# Altium footprint library Connector FPC.PcbLib: 30 footprints (part 2 of 2)
Each footprint in its own frame and in the unit in brackets; x right, y up, seen from the top. Pads: shape width x height; smd on the part's side, far side on the other; paste and mask are expansions set on the pad; w line width, h text height; cw(c..) or ccw(c..) is an arc to the next point about the centre after c.
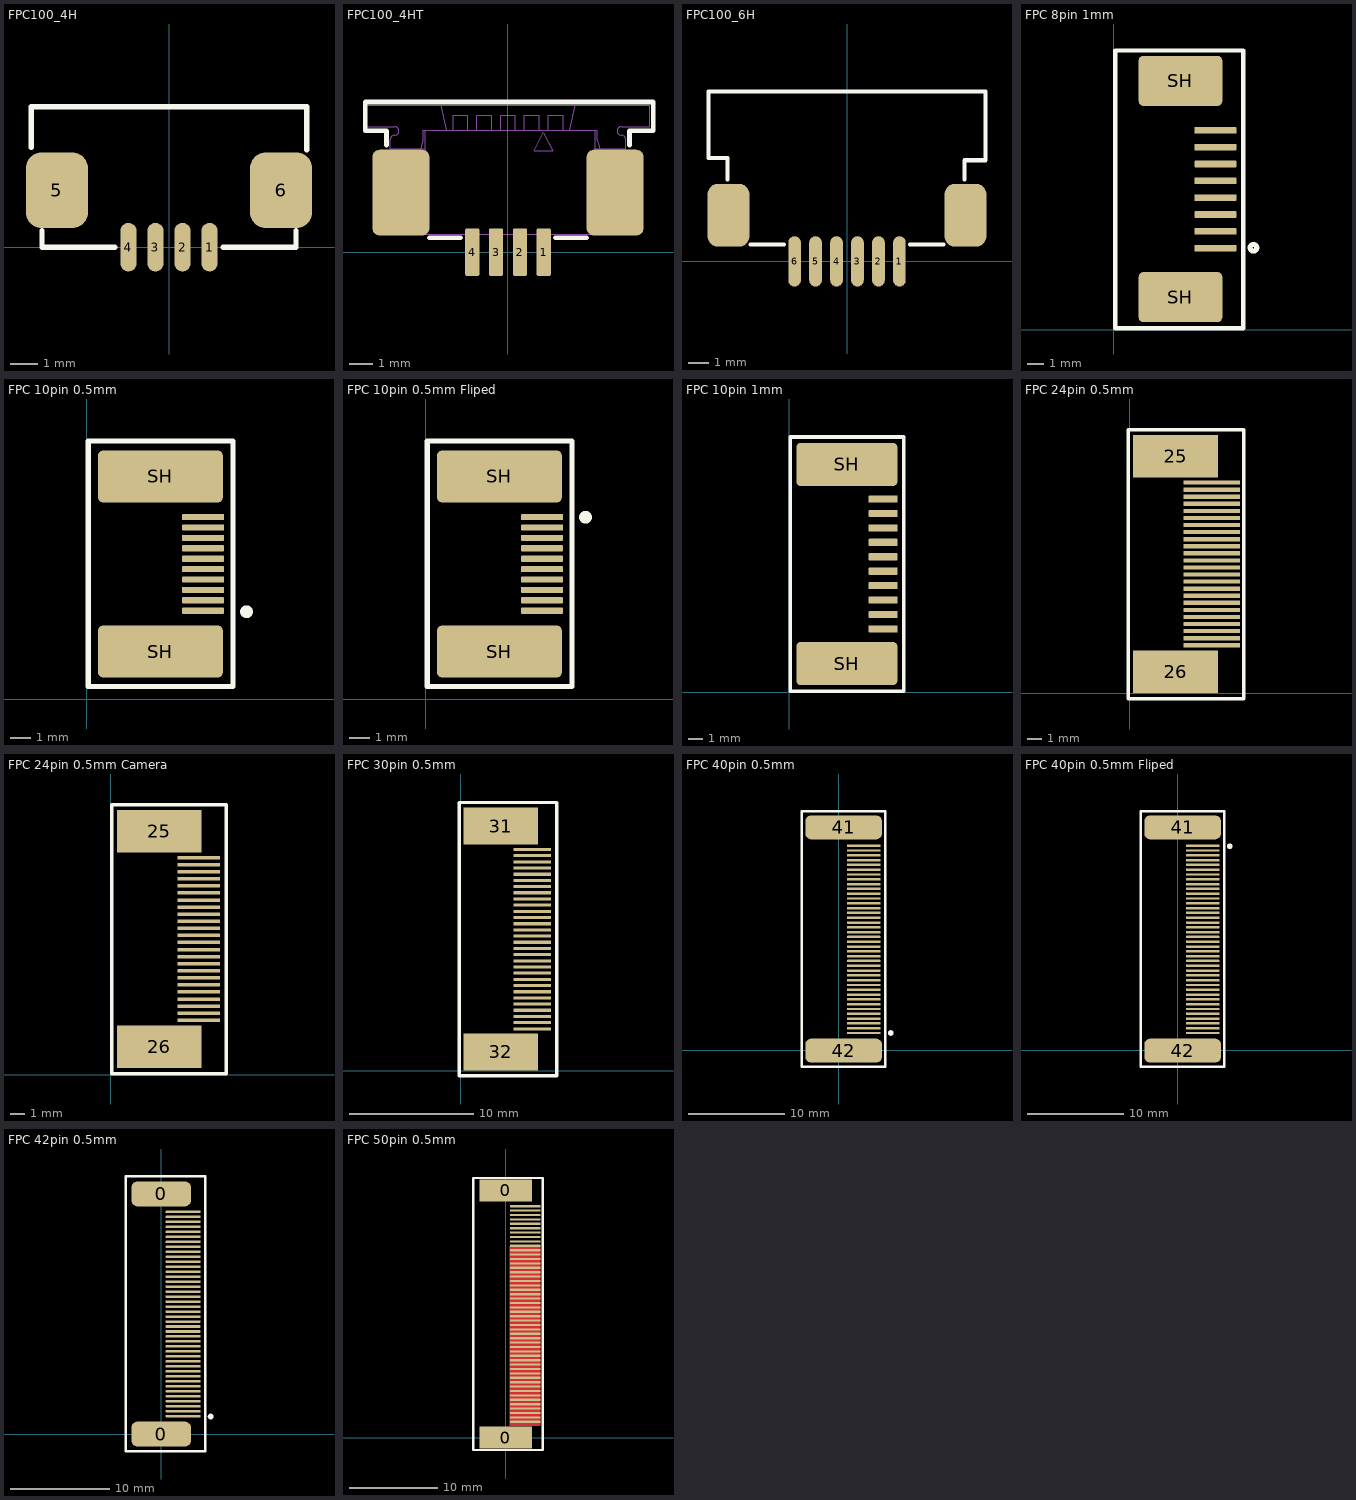
[diagram p1: the footprints below, top view; thin cyan lines are the x and y axes]

## FPC100_4H [mm] "FPC, 1mm, Horizental, Bot. Contact, Molex 200529-0040"
height 0.8
pads (6):
  oval 0.6x1.8 smd: 1(1.5,0) 2(0.5,0) 3(-0.5,0) 4(-1.5,0)
  rrect50% 2.3x2.8 smd: 5(-4.15,2.1) 6(4.15,2.1)
Top Overlay:
  lines w0.2: -5.1,3.7 -5.1,5.2 5.1,5.2 5.1,3.6 ; -4.7,0.6 -4.7,0 -2,0 ; 2,0 4.7,0 4.7,0.6
3D body "2005290040.stp": height 1.93, standoff -0.03, extent -5,-0.25 5,5.05

## FPC100_4HT [mm] "TE Connectivity 4-pin ZIF connector TE84953-4"
height 2.74
pads (6):
  rrect25% 0.6x2 smd: 1(1.5,0) 2(0.5,0) 3(-0.5,0) 4(-1.5,0)
  rrect25% 2.4x3.6 smd: ""(-4.5,2.5) ""(4.5,2.5)
Top Overlay:
  lines w0.2: -5.1,4.5 -5.1,5.1 -6,5.1 -6,6.3 6.1,6.3 6.1,5.1 5.1,5.1 5.1,4.5 ; -3.3,0.6 -2,0.6 ; 2,0.6 3.3,0.6
Mechanical 13:
  lines w0.05: -4.56,0.75 -4.56,4.25 -3.47,4.25 -3.47,5.12 ; -4.56,3.2 -4.18,3.2 ; -4.28,4.25 -4.18,3.877 -4.18,2.98 -3.93,2.98 ; -4.229,4.25 -4.232,4.26 -5.072,4.26 ccw(c-5.072,4.16) -5.172,4.16 -5.172,3.859 ccw(c-5.072,3.859) -5.072,3.759 -4.762,3.759 cw(c-4.762,3.659) -4.662,3.659 -4.662,3.357 cw(c-4.762,3.357) -4.762,3.257 -5.072,3.257 ccw(c-5.072,3.157) -5.172,3.157 -5.172,2.856 ccw(c-5.072,2.856) -5.072,2.756 -4.762,2.756 cw(c-4.762,2.656) -4.662,2.656 -4.662,2.355 cw(c-4.762,2.355) -4.762,2.255 -5.072,2.255 ccw(c-5.072,2.155) -5.172,2.155 -5.172,1.853 ccw(c-5.072,1.853) -5.072,1.753 -4.762,1.753 cw(c-4.762,1.653) -4.662,1.653 -4.662,1.352 cw(c-4.762,1.352) -4.762,1.252 -5.072,1.252 ccw(c-5.072,1.152) -5.172,1.152 -5.172,0.85 ccw(c-5.072,0.85) -5.072,0.75 5.072,0.75 ccw(c5.072,0.85) 5.172,0.85 5.172,1.152 ccw(c5.072,1.152) 5.072,1.252 4.762,1.252 cw(c4.762,1.352) 4.662,1.352 4.662,1.653 cw(c4.762,1.653) 4.762,1.753 5.072,1.753 ccw(c5.072,1.853) 5.172,1.853 5.172,2.155 ccw(c5.072,2.155) 5.072,2.255 4.762,2.255 cw(c4.762,2.355) 4.662,2.355 4.662,2.656 cw(c4.762,2.656) 4.762,2.756 5.072,2.756 ccw(c5.072,2.856) 5.172,2.856 5.172,3.157 ccw(c5.072,3.157) 5.072,3.257 4.762,3.257 cw(c4.762,3.357) 4.662,3.357 4.662,3.659 cw(c4.762,3.659) 4.762,3.759 5.072,3.759 ccw(c5.072,3.859) 5.172,3.859 5.172,4.16 ccw(c5.072,4.16) 5.072,4.26 3.982,4.26 3.982,4.25 ; -3.93,0.75 -3.93,3.877 -3.83,4.25 ; -3.646,4.33 -3.55,4.69 -3.55,5.12 3.75,5.12 3.75,4.69 3.847,4.33 ; -3.47,4.33 -4.94,4.33 -4.94,4.73 cw(c-4.76,4.73) -4.76,4.91 ccw(c-4.76,5.09) -4.76,5.27 -5.96,5.27 -5.96,6.16 5.96,6.16 5.96,5.27 4.76,5.27 ccw(c4.76,5.09) 4.76,4.91 cw(c4.76,4.73) 4.94,4.73 4.94,4.33 3.67,4.33 ; -2.82,6.16 -2.59,5.12 ; -2.309,5.12 -2.309,5.75 -1.689,5.75 -1.689,5.12 ; -1.604,-0.26 -1.404,-0.26 ; -1.604,0.11 -1.404,0.11 ; -1.604,0.24 -1.404,0.24 ; -1.604,0.75 -1.604,-0.39 -1.404,-0.39 -1.404,0.75 ; -1.309,5.12 -1.309,5.75 -0.689,5.75 -0.689,5.12 ; -0.604,-0.26 -0.404,-0.26 ; -0.604,0.11 -0.404,0.11 ; -0.604,0.24 -0.404,0.24 ; -0.604,0.75 -0.604,-0.39 -0.404,-0.39 -0.404,0.75 ; -0.309,5.12 -0.309,5.75 0.311,5.75 0.311,5.12 ; 0.396,-0.26 0.596,-0.26 ; 0.396,0.11 0.596,0.11 ; 0.396,0.24 0.596,0.24 ; 0.396,0.75 0.396,-0.39 0.596,-0.39 0.596,0.75 ; 0.691,5.12 0.691,5.75 1.311,5.75 1.311,5.12 ; 1.396,-0.26 1.596,-0.26 ; 1.396,0.11 1.596,0.11 ; 1.396,0.24 1.596,0.24 ; 1.396,0.75 1.396,-0.39 1.596,-0.39 1.596,0.75 ; 1.691,5.12 1.691,5.75 2.311,5.75 2.311,5.12 ; 2.59,5.12 2.82,6.16 ; 3.67,5.12 3.67,4.25 4.56,4.25 4.56,0.75 ; 3.83,0.75 3.93,1.123 3.93,4.25 ; 3.93,2.02 4.56,2.02 ; 4.18,2.02 4.18,1.123 4.28,0.75 ; 4.18,4.25 4.18,4.26 ; 1.111,4.25 1.871,4.25 1.491,5.01 1.111,4.25
3D body "ZIF Conn TE 84953-4.STEP": height 2.58, standoff 0, extent -5.96,-0.39 5.96,6.16

## FPC100_6H [mm] "FPC 6pin pitch: 1.0mm, Molex 52271-0679"
height 3
pads (8):
  oval 0.6x2.4 smd: 1(2.5,0) 2(1.5,0) 3(0.5,0) 4(-0.5,0) 5(-1.5,0) 6(-2.5,0)
  rrect50% 2x3 smd: ""(-5.65,2.2) ""(5.65,2.2)
Top Overlay:
  lines w0.2: -5.7,3.9 -5.7,4.925 -6.6,4.925 -6.6,8.1 6.6,8.1 6.6,4.825 5.6,4.825 5.6,3.9 ; -4.6,0.8 -3,0.8 ; 3,0.8 4.6,0.8
3D body "522710679.stp": height 3, standoff 0, extent -6.5,-0.7 6.5,8

## FPC 8pin 1mm [mm] "FPC connector 8pin 1mm"
pads (10):
  rrect20% 2.5x0.4 smd: 1(6.081,4.867) 2(6.081,5.872) 3(6.081,6.876) 4(6.081,7.881) 5(6.081,8.886) 6(6.081,9.891) 7(6.081,10.895) 8(6.081,11.9)
  rrect20% 5x3 smd: SH(3.996,1.943) SH(3.996,14.851)
Top Overlay:
  lines w0.254: 0.098,0.088 0.098,16.661 7.75,16.661 7.75,0.088 0.098,0.088
  lines w0.3: 8.541,4.961 ccw(c8.355,4.887) 8.555,4.897
3D body "19r9649_84952-8.stp": height 2.54, standoff -0.02, extent 0.412,0.431 6.952,16.361

## FPC 10pin 0.5mm [mm] "FPC connector 10pin 0.5mm"
pads (12):
  rrect20% 2x0.3 smd: 1(5.581,4.258) 2(5.581,4.758) 3(5.581,5.258) 4(5.581,5.758) 5(5.581,6.258) 6(5.581,6.758) 7(5.581,7.258) 8(5.581,7.758) 9(5.581,8.258) 10(5.581,8.758)
  rrect20% 6x2.5 smd: SH(3.535,2.298) SH(3.535,10.71)
Top Overlay:
  lines w0.254: 0.065,0.624 7.022,0.624 7.022,12.411 0.065,12.411 0.065,0.624
  lines w0.3: 7.798,4.303 ccw(c7.671,4.213) 7.808,4.288
3D body "sfv10r1stae1hlf.stp": height 1.85, standoff -0.02, extent 0.586,1.241 5.486,11.741

## FPC 10pin 0.5mm Fliped [mm] "FPC connector 10pin 0.5mm"
pads (12):
  rrect20% 2x0.3 smd: 1(5.581,8.758) 2(5.581,8.258) 3(5.581,7.758) 4(5.581,7.258) 5(5.581,6.758) 6(5.581,6.258) 7(5.581,5.758) 8(5.581,5.258) 9(5.581,4.758) 10(5.581,4.258)
  rrect20% 6x2.5 smd: SH(3.535,2.298) SH(3.535,10.71)
Top Overlay:
  lines w0.254: 0.065,0.624 0.065,12.411 7.022,12.411 7.022,0.624 0.065,0.624
  lines w0.3: 7.798,8.839 ccw(c7.671,8.749) 7.808,8.824
3D body "sfv10r1stae1hlf.stp": height 1.85, standoff -0.02, extent 0.586,1.241 5.486,11.741

## FPC 10pin 1mm [mm] "FPC connector 10pin 1mm"
pads (12):
  rrect20% 2x0.5 smd: 1(6.512,4.395) 2(6.512,5.395) 3(6.512,6.395) 4(6.512,7.395) 5(6.512,8.395) 6(6.512,9.395) 7(6.512,10.395) 8(6.512,11.395) 9(6.512,12.395) 10(6.512,13.395)
  rrect20% 7x3 smd: SH(4,1.991) SH(4,15.795)
Top Overlay:
  lines w0.254: 0.062,0.076 7.953,0.076 7.953,17.7 0.062,17.7 0.062,0.076
3D body "ffc_fpc_affc20-10-100-shb-t.stp": height 2.8, standoff 0, extent 0.348,0.393 7.148,17.393

## FPC 24pin 0.5mm [mm] "FPC connector 24pin 0.5mm"
pads (26):
  rect 4x0.3 smd: 1(5.79,3.39) 2(5.79,3.89) 3(5.79,4.39) 4(5.79,4.89) 5(5.79,5.39) 6(5.79,5.89) 7(5.79,6.39) 8(5.79,6.89) 9(5.79,7.39) 10(5.79,7.89) 11(5.79,8.39) 12(5.79,8.89) 13(5.79,9.39) 14(5.79,9.89) 15(5.79,10.39) 16(5.79,10.89) 17(5.79,11.39) 18(5.79,11.89) 19(5.79,12.39) 20(5.79,12.89) 21(5.79,13.39) 22(5.79,13.89) 23(5.79,14.39) 24(5.79,14.89)
  rect 6x3 smd: 25(3.24,16.74) 26(3.24,1.53)
Top Overlay:
  lines w0.254: -0.11,-0.4 -0.11,18.62 8.07,18.62 8.07,-0.4 -0.11,-0.4
3D body "5603.stp": height 2, standoff -0.04, extent 0.13,-0.18 6.93,18.42

## FPC 24pin 0.5mm Camera [mm] "FPC connector 24pin 0.5mm"
pads (26):
  rect 3x0.25 smd: 1(6.2,3.85) 2(6.2,4.35) 3(6.2,4.85) 4(6.2,5.35) 5(6.2,5.85) 6(6.2,6.35) 7(6.2,6.85) 8(6.2,7.35) 9(6.2,7.85) 10(6.2,8.35) 11(6.2,8.85) 12(6.2,9.35) 13(6.2,9.85) 14(6.2,10.35) 15(6.2,10.85) 16(6.2,11.35) 17(6.2,11.85) 18(6.2,12.35) 19(6.2,12.85) 20(6.2,13.35) 21(6.2,13.85) 22(6.2,14.35) 23(6.2,14.85) 24(6.2,15.35)
  rect 6x3 smd: 25(3.42,17.2) 26(3.42,1.99)
Top Overlay:
  lines w0.254: 0.07,0.06 8.142,0.06 8.142,19.08 0.07,19.08 0.07,0.06
3D body "5603.stp": height 2, standoff -0.04, extent 0.31,0.28 7.11,18.88
3D body "User Library-ov9655.STEP": height 5.85, standoff -0.18, extent -17.35,3.39 4.15,15.89

## FPC 30pin 0.5mm [mm] "FPC connector 24pin 0.5mm"
pads (32):
  rect 3x0.25 smd: 1(5.79,3.39) 2(5.79,3.89) 3(5.79,4.389) 4(5.79,4.889) 5(5.79,5.389) 6(5.79,5.888) 7(5.79,6.388) 8(5.79,6.888) 9(5.79,7.387) 10(5.79,7.887) 11(5.79,8.387) 12(5.79,8.886) 13(5.79,9.386) 14(5.79,9.885) 15(5.79,10.385) 16(5.79,10.885) 17(5.79,11.384) 18(5.79,11.884) 19(5.79,12.384) 20(5.79,12.883) 21(5.79,13.383) 22(5.79,13.883) 23(5.79,14.382) 24(5.79,14.882) 25(5.79,15.382) 26(5.79,15.881) 27(5.79,16.381) 28(5.79,16.881) 29(5.79,17.38) 30(5.79,17.88)
  rect 6x3 smd: 31(3.24,19.767) 32(3.24,1.53)
Top Overlay:
  lines w0.254: -0.11,-0.4 7.762,-0.4 7.762,21.677 -0.11,21.677 -0.11,-0.4
3D body "affc20-30-050-sht-r.stp": height 2.02, standoff -0.02, extent 0.821,0.385 6.221,20.885

## FPC 40pin 0.5mm [mm] "FPC connector 42pin 1mm"
pads (42):
  rrect50% 3.5x0.254 smd: 1(2.59,1.8) 2(2.59,2.3) 3(2.59,2.8) 4(2.59,3.3) 5(2.59,3.8) 6(2.59,4.3) 7(2.59,4.8) 8(2.59,5.3) 9(2.59,5.8) 10(2.59,6.3) 11(2.59,6.8) 12(2.59,7.3) 13(2.59,7.8) 14(2.59,8.3) 15(2.59,8.8) 16(2.59,9.3) 17(2.59,9.8) 18(2.59,10.3) 19(2.59,10.8) 20(2.59,11.3) 21(2.59,11.8) 22(2.59,12.3) 23(2.59,12.8) 24(2.59,13.3) 25(2.59,13.8) 26(2.59,14.3) 27(2.59,14.8) 28(2.59,15.3) 29(2.59,15.8) 30(2.59,16.3) 31(2.59,16.8) 32(2.59,17.3) 33(2.59,17.8) 34(2.59,18.3) 35(2.59,18.8) 36(2.59,19.3) 37(2.59,19.8) 38(2.59,20.3) 39(2.59,20.8) 40(2.59,21.3)
  rrect50% 8x2.5 smd: 41(0.5,23.202) 42(0.5,-0.03)
Top Overlay:
  circle w0.3: c5.4,1.8 r0.141
  lines w0.254: -3.85,-1.696 -3.85,24.863 4.85,24.863 4.85,-1.696 -3.85,-1.696
3D body "31805.stp": height 2.5, standoff -0.05, extent -3.398,-0.898 3.802,24.002

## FPC 40pin 0.5mm Fliped [mm] "FPC connector 42pin 1mm"
pads (42):
  rrect50% 3.5x0.254 smd: 1(2.59,21.3) 2(2.59,20.8) 3(2.59,20.3) 4(2.59,19.8) 5(2.59,19.3) 6(2.59,18.8) 7(2.59,18.3) 8(2.59,17.8) 9(2.59,17.3) 10(2.59,16.8) 11(2.59,16.3) 12(2.59,15.8) 13(2.59,15.3) 14(2.59,14.8) 15(2.59,14.3) 16(2.59,13.8) 17(2.59,13.3) 18(2.59,12.8) 19(2.59,12.3) 20(2.59,11.8) 21(2.59,11.3) 22(2.59,10.8) 23(2.59,10.3) 24(2.59,9.8) 25(2.59,9.3) 26(2.59,8.8) 27(2.59,8.3) 28(2.59,7.8) 29(2.59,7.3) 30(2.59,6.8) 31(2.59,6.3) 32(2.59,5.8) 33(2.59,5.3) 34(2.59,4.8) 35(2.59,4.3) 36(2.59,3.8) 37(2.59,3.3) 38(2.59,2.8) 39(2.59,2.3) 40(2.59,1.8)
  rrect50% 8x2.5 smd: 41(0.5,23.202) 42(0.5,-0.03)
Top Overlay:
  circle w0.3: c5.4,21.24 r0.141
  lines w0.254: -3.85,-1.696 4.85,-1.696 4.85,24.863 -3.85,24.863 -3.85,-1.696
3D body "31805.stp": height 2.5, standoff -0.05, extent -3.398,-0.898 3.802,24.002

## FPC 42pin 0.5mm [mm] "FPC connector 42pin 1mm"
pads (44):
  rrect50% 6x2.5 smd: 0(0,0) 0(0,24.11)
  rrect50% 3.5x0.254 smd: 1(2.2,1.8) 2(2.2,2.3) 3(2.2,2.8) 4(2.2,3.3) 5(2.2,3.8) 6(2.2,4.3) 7(2.2,4.8) 8(2.2,5.3) 9(2.2,5.8) 10(2.2,6.3) 11(2.2,6.8) 12(2.2,7.3) 13(2.2,7.8) 14(2.2,8.3) 15(2.2,8.8) 16(2.2,9.3) 17(2.2,9.8) 18(2.2,10.3) 19(2.2,10.8) 20(2.2,11.3) 21(2.2,11.8) 22(2.2,12.3) 23(2.2,12.8) 24(2.2,13.3) 25(2.2,13.8) 26(2.2,14.3) 27(2.2,14.8) 28(2.2,15.3) 29(2.2,15.8) 30(2.2,16.3) 31(2.2,16.8) 32(2.2,17.3) 33(2.2,17.8) 34(2.2,18.3) 35(2.2,18.8) 36(2.2,19.3) 37(2.2,19.8) 38(2.2,20.3) 39(2.2,20.8) 40(2.2,21.3) 41(2.2,21.8) 42(2.2,22.3)
Top Overlay:
  circle w0.3: c4.96,1.76 r0.141
  lines w0.254: -3.54,-1.71 4.41,-1.71 4.41,25.88 -3.54,25.88 -3.54,-1.71
3D body "4-1734839-2.stp": height 2.05, standoff 0, extent -2.535,-1.17 2.575,25.26

## FPC 50pin 0.5mm [mm] "FPC connector 50pin 0.5mm"
pads (52):
  rect 6x2.5 smd: 0(0,0) 0(0,28.1)
  rect 3.5x0.254 smd: 1(2.2,1.8) 2(2.2,2.3) 3(2.2,2.8) 4(2.2,3.3) 5(2.2,3.8) 6(2.2,4.3) 7(2.2,4.8) 8(2.2,5.3) 9(2.2,5.8) 10(2.2,6.3) 11(2.2,6.8) 12(2.2,7.3) 13(2.2,7.8) 14(2.2,8.3) 15(2.2,8.8) 16(2.2,9.3) 17(2.2,9.8) 18(2.2,10.3) 19(2.2,10.8) 20(2.2,11.3) 21(2.2,11.8) 22(2.2,12.3) 23(2.2,12.8) 24(2.2,13.3) 25(2.2,13.8) 26(2.2,14.3) 27(2.2,14.8) 28(2.2,15.3) 29(2.2,15.8) 30(2.2,16.3) 31(2.2,16.8) 32(2.2,17.3) 33(2.2,17.8) 34(2.2,18.3) 35(2.2,18.8) 36(2.2,19.3) 37(2.2,19.8) 38(2.2,20.3) 39(2.2,20.8) 40(2.2,21.3) 41(2.2,21.8) 42(2.2,22.3) 43(2.2,22.8) 44(2.2,23.3) 45(2.2,23.8) 46(2.2,24.3) 47(2.2,24.8) 48(2.2,25.3) 49(2.2,25.8) 50(2.2,26.3)
Top Layer:
  pour cut-out: 0.475,1.35 3.925,1.35 3.925,21.775 0.425,21.775
Top Overlay:
  lines w0.254: -3.7,-1.4 -3.7,29.5 4.2,29.5 4.2,-1.4 -3.7,-1.4
3D body "541045033.stp": height 2.06, standoff 0.01, extent -3.775,-1.2 3.375,29.3